# Altium footprint library PLC1.PcbLib: 118 footprints (part 6 of 8)
Each footprint in its own frame and in the unit in brackets; x right, y up, seen from the top. Pads: shape width x height; smd on the part's side, far side on the other; paste and mask are expansions set on the pad; w line width, h text height; cw(c..) or ccw(c..) is an arc to the next point about the centre after c.
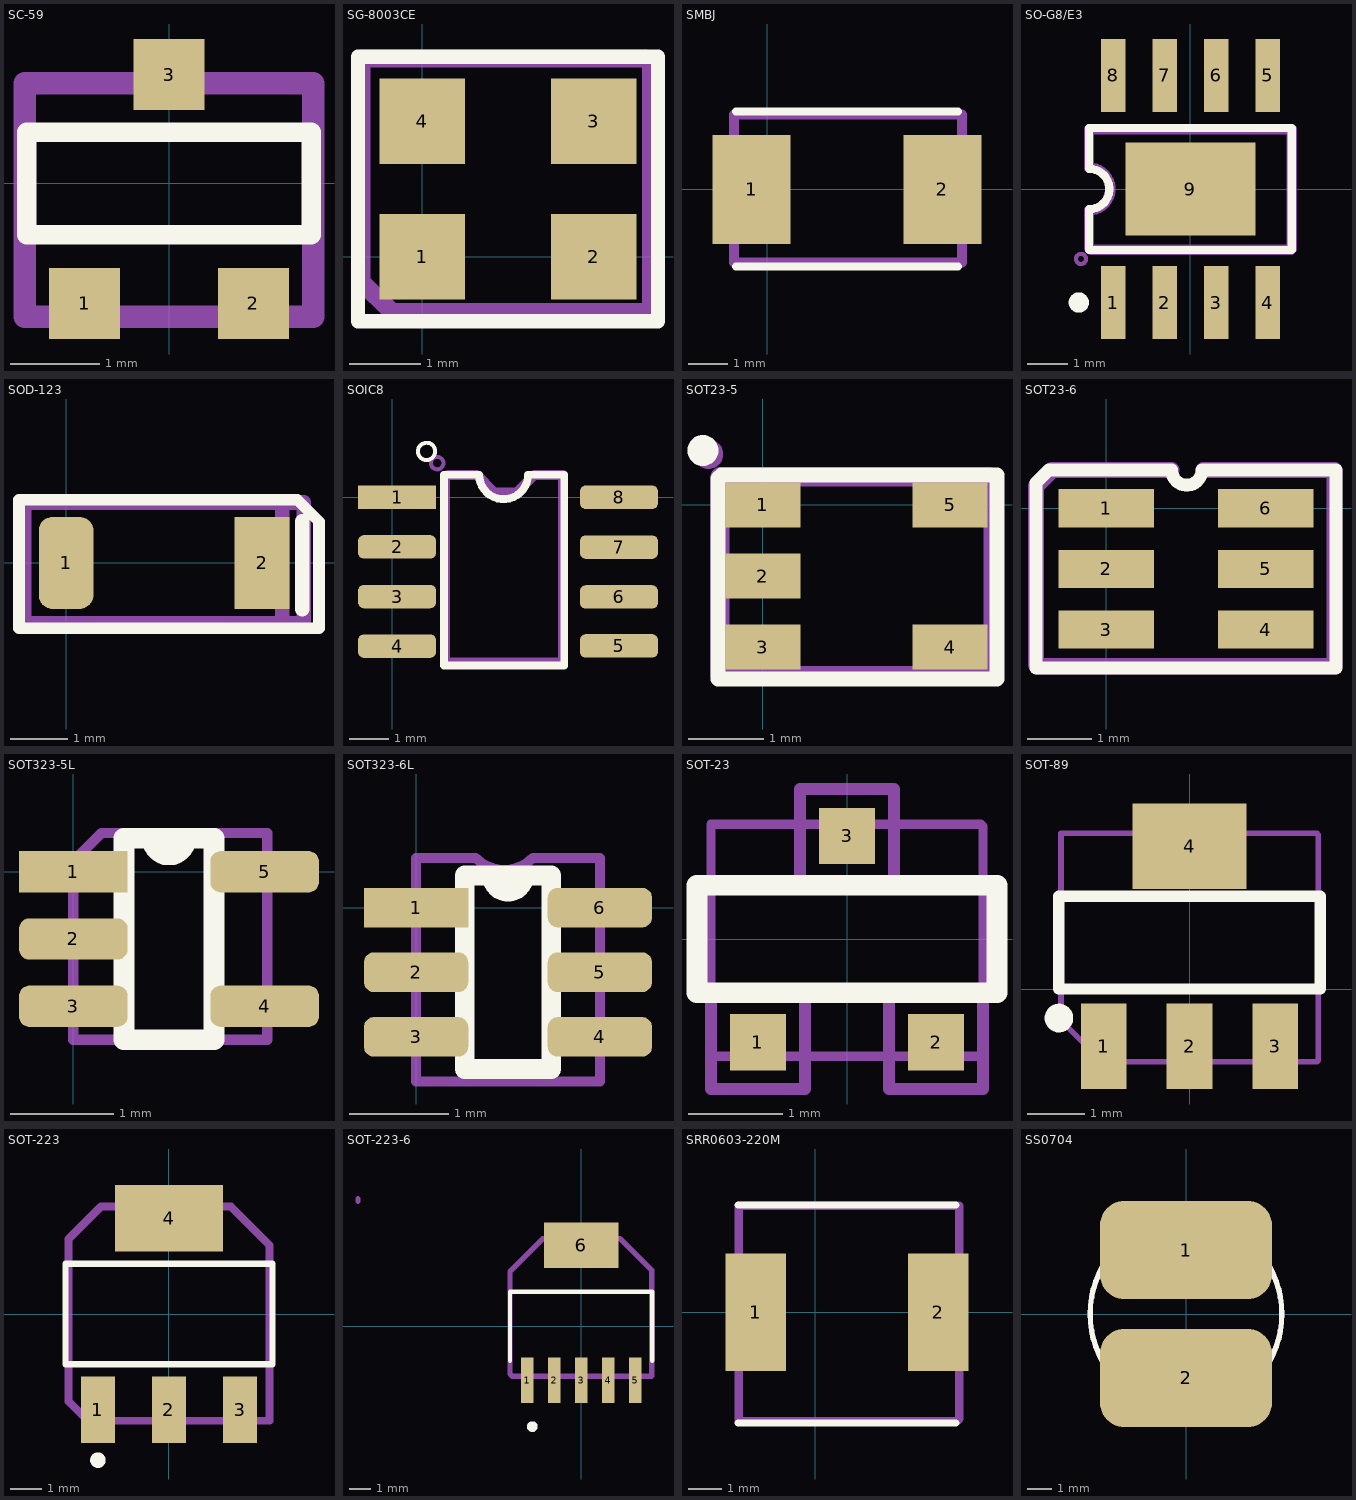
[diagram p5: the footprints below, top view; thin cyan lines are the x and y axes]

## SC-59 [mm] "SOT23, 3-Leads, Body 2.9x1.3mm, Pitch 0.95mm, Lead Span 2.3mm - Reverse Pinning, IPC Medium Density"
height 1.1
pads (3):
  rect 0.8x0.8 smd: 1(-0.95,-1.35) 2(0.95,-1.35) 3(0,1.225)
Top Overlay:
  lines w0.22: -1.6,-0.575 1.6,-0.575 1.6,0.575 -1.6,0.575 -1.6,-0.575
Mechanical 13:
  lines w0.127: -1.5,-0.6 1.5,-0.6 ; -1.5,0.6 1.5,0.6
Top Assy:
  lines w0.254: 1.625,-1.5 1.625,1.125 -1.625,1.125 -1.625,-1.5 1.625,-1.5 ; 1.625,-1.5 1.625,-1.5
  text ".Designator" at -1.4,-0.4 h0.7
3D body "User Library-P-SC 59-3-X HALL EFFECT.step": height 1.36, standoff -0.04, extent -1.525,-1.475 1.475,1.324

## SG-8003CE [mm]
pads (4):
  rect 1.2x1.2 smd: 1(0,0) 2(2.4,0) 3(2.4,1.9) 4(0,1.9)
Top Overlay:
  lines w0.2: -0.9,-0.9 -0.9,2.8 3.3,2.8 3.3,-0.9 -0.9,-0.9
Top Assy:
  lines w0.254: -0.85,-0.35 -0.85,2.775 3.125,2.775 3.2,2.7 3.2,-0.775 -0.425,-0.775 -0.85,-0.35
  text ".Designator" at -0.375,0.45 h0.7

## SMBJ [mm] "SMBJ"
height 2
pads (2):
  rect 2x2.8 smd: 1(-0.4,0) 2(4.5,0)
Top Overlay:
  lines w0.2: -0.8,-1.975 4.9,-1.975 ; -0.8,2 2.275,2 4.9,2 ; 4.9,2 4.9,2
Top Assy:
  lines w0.254: -0.85,-1.875 -0.85,1.925 5,1.925 5,-1.875 -0.85,-1.875
  text ".Designator" at -0.1,-0.275 h0.7
3D body "User Library-DO-214AA(SMB).step": height 2.6, standoff -0.05, extent -0.794,-1.975 4.794,1.975

## SO-G8/E3 [mm] "Small Outline; 8 Leads; Body Width 3.9 mm; Pitch 1.27 mm"
height 1.55
pads (9):
  rect 0.6x1.8 smd: 1(-1.905,-2.8) 2(-0.635,-2.8) 3(0.635,-2.8) 4(1.905,-2.8) 5(1.905,2.8) 6(0.635,2.8) 7(-0.635,2.8) 8(-1.905,2.8)
  rect 3.2x2.3 smd: 9(0,0)
Top Overlay:
  circle w0.25: c-2.755,-2.8 r0.125
  lines w0.2: -2.5,-1.5 2.5,-1.5 2.5,1.5 -2.5,1.5 -2.5,0.5 cw(c-2.5,0) -2.5,-0.5 -2.5,-1.5
Top Assy:
  circle w0.1: c-2.7,-1.725 r0.125
  lines w0.254: -2.5,-1.45 -2.45,-1.5 2.475,-1.5 2.5,-1.475 2.5,1.45 2.5,1.475 -2.5,1.475 -2.5,0.525 cw(c-2.499,0) -2.5,-0.525 -2.5,-1.45
  text ".Designator" at -1.7,-0.45 h0.7
3D body "CircuitWorks-SO-8.step": height 1.45, standoff 0, extent -2.5,-2.889 2.402,2.889

## SOD-123 [mm]
pads (2):
  rrect50% 0.95x1.6 smd: 1(0,0)
  rect 0.95x1.6 smd: 2(3.4,0)
Top Overlay:
  lines w0.2: -0.818,-1.137 -0.818,1.1 4.008,1.1 4.389,0.719 4.389,-1.137 3.168,-1.137 2.67,-1.137 2.19,-1.137 -0.818,-1.137
  lines w0.254: 4.1,-0.8 4.1,0.724
Top Assy:
  lines w0.254: 3.75,-0.925 3.75,0.9 ; -0.775,-1.05 4.125,-1.05 4.125,1.05 -0.725,1.05 -0.725,-1 -0.775,-1.05
  text ".Designator" at -0.3,-0.35 h0.7
3D body "User Library-MBR140SF.STEP": height 0.95, standoff 0, extent -0.175,-0.825 3.425,0.825

## SOIC8 [mm]
pads (8):
  rect 2x0.6 smd: 1(0.125,0)
  rrect50% 2x0.6 smd: 2(0.125,-1.27) 3(0.125,-2.54) 4(0.125,-3.81) 5(5.8,-3.8) 6(5.8,-2.55) 7(5.8,-1.275) 8(5.8,0)
Top Overlay:
  lines w0.1: 1.1,1.175 cw(c0.879,1.175) 1.1,1.182
  lines w0.2: 3.475,0.575 cw(c2.85,0.575) 2.225,0.575 1.325,0.575 1.325,-4.3 4.4,-4.3 4.4,0.575 3.5,0.575
Top Assy:
  circle w0.1: c1.15,0.875 r0.16
  lines w0.254: 1.35,-4.225 1.35,0.5 1.425,0.575 2.163,0.575 2.612,0.125 3.188,0.125 3.638,0.575 4.375,0.575 4.375,0.45 4.375,-4.225 1.35,-4.225
  text ".Designator" at 3.225,-3.875 h0.7
3D body "CircuitWorks-SO-8.step": height 1.45, standoff 0, extent 0.075,-4.351 5.853,0.551

## SOT23-5 [mm]
pads (5):
  rect 1x0.6 smd: 1(0,0) 2(0,-0.95) 3(0,-1.9) 4(2.5,-1.9) 5(2.5,0)
Top Overlay:
  circle w0.254: c-0.8,0.725 r0.079
  lines w0.2: -0.6,-2.325 -0.6,0.35 -0.55,0.4 1.275,0.4 3.125,0.4 3.125,-2.325 -0.6,-2.325
Top Assy:
  circle w0.1: c-0.725,0.675 r0.146
  lines w0.254: -0.575,-2.275 3.075,-2.275 3.075,0.325 3.025,0.375 -0.575,0.375 -0.575,-2.275
  text ".Designator" at -0.25,-1.225 h0.7
3D body "CircuitWorks-SOT-23-5.step": height 1.1, standoff 0, extent 0.025,-2.45 2.525,0.55

## SOT23-6 [mm]
pads (6):
  rect 1.5x0.6 smd: 1(0,0) 2(0,-0.95) 3(0,-1.9) 4(2.5,-1.9) 5(2.5,-0.95) 6(2.5,0)
Top Overlay:
  lines w0.2: -1.1,-2.5 3.6,-2.5 3.6,0.6 1.5,0.6 cw(c1.262,0.6) 1.025,0.6 -0.9,0.6 -1.1,0.4 -1.1,-2.5
Top Assy:
  lines w0.1: 1.025,0.625 ccw(c1.277,0.652) 1.525,0.6
  lines w0.254: 1.025,0.6 -0.85,0.6 -1.1,0.35 -1.1,-2.45 -1.075,-2.475 3.575,-2.475 3.575,0.6 1.525,0.6
  text ".Designator" at -0.7,-1.225 h0.7

## SOT323-5L [mm]
height 5
pads (5):
  rect 1.05x0.4 smd: 1(0,0)
  rrect50% 1.05x0.4 smd: 2(0,-0.65) 3(0,-1.3) 4(1.85,-1.3) 5(1.85,0)
Top Overlay:
  lines w0.2: 0.49,-1.625 1.36,-1.625 1.36,0.325 0.763,0.325 ccw(c0.925,0.325) 1.087,0.325 0.49,0.325 0.49,-1.625
Top Assy:
  lines w0.1: 0,-1.625 1.875,-1.625 1.875,0.375 1.406,0.375 1.05,0.375 0.469,0.375 0.275,0.375 0,0.1 0,-1.625
  text ".Designator" at 1.325,-1.425 h0.7
3D body "28014.stp": height 0.92, standoff -0.03, extent -0.125,-1.65 1.975,0.35

## SOT323-6L [mm]
pads (6):
  rect 1.05x0.4 smd: 1(0,0)
  rrect50% 1.05x0.4 smd: 2(0,-0.65) 3(0,-1.3) 4(1.85,-1.3) 5(1.85,-0.65) 6(1.85,0)
Top Overlay:
  lines w0.2: 0.49,-1.625 0.49,0.325 1.087,0.325 cw(c0.925,0.325) 0.763,0.325 1.36,0.325 1.36,-1.625 0.49,-1.625
Top Assy:
  lines w0.1: 0,-1.75 0,0.5 0.025,0.5 0.6,0.5 ccw(c0.887,0.787) 1.175,0.5 1.85,0.5 1.85,-1.75 0,-1.75
  text ".Designator" at 1.325,-1.6 h0.7
3D body "28014.stp": height 0.92, standoff -0.03, extent -0.125,-1.65 1.975,0.35

## SOT-23 [mm] "SOT23, 3-Leads, Body 2.9x1.3mm, Pitch 0.95mm, Lead Span 2.3mm - Reverse Pinning, IPC Medium Density"
height 1.1
pads (3):
  rect 0.6x0.6 smd: 1(-0.95,-1.1) 2(0.95,-1.1) 3(0,1.1)
Top Overlay:
  lines w0.22: -1.6,-0.575 -1.6,0.575 1.6,0.575 1.6,-0.575 -1.6,-0.575
Mechanical 13:
  lines w0.127: -1.45,-0.6 -1.45,-1.6 -0.45,-1.6 -0.45,-0.6 ; -0.5,0.6 -0.5,1.6 0.5,1.6 0.5,0.6 ; 0.45,-0.6 0.45,-1.6 1.45,-1.6 1.45,-0.6 ; -1.5,-0.6 1.5,-0.6 1.5,0.6 -1.5,0.6 -1.5,-0.6
Top Assy:
  lines w0.1: -1.45,-1.25 1.4,-1.25 1.45,-1.2 1.45,1.2 1.425,1.225 -1.45,1.225 -1.45,-1.25
  text ".Designator" at -1.225,-0.275 h0.7
3D body "SW3dPS-3-lead sot23-3.STEP": height 1.01, standoff -0.01, extent -1.46,-1.25 1.46,1.226

## SOT-89 [mm] "SOT-223/SC-73; 4 Leads; Body 6.7 x 7.3 mm, inc. leads (LxW max)"
height 1.8
pads (4):
  rect 0.8x1.5 smd: 1(-1.5,-1) 2(0,-1) 3(1.5,-1)
  rect 2x1.5 smd: 4(0,2.5)
Top Overlay:
  circle w0.25: c-2.286,-0.508 r0.125
  lines w0.2: -2.286,0 -2.286,1.625 2.286,1.625 2.286,0 -2.286,0
Top Assy:
  lines w0.1: -2.25,-0.55 -1.525,-1.275 2.225,-1.275 2.25,-1.25 2.25,2.7 2.225,2.725 -2.25,2.725 -2.25,-0.55
  text ".Designator" at -2.025,0.575 h0.7
3D body "CircuitWorks-SOT89.step": height 1.5, standoff 0, extent -2.25,-1.275 2.25,2.725

## SOT-223 [mm] "SOT-223/SC-73; 4 Leads; Body 6.7 x 7.3 mm, inc. leads (LxW max)"
height 1.8
pads (4):
  rect 1.1x2.15 smd: 1(-2.3,-3.1) 2(0,-3.1) 3(2.3,-3.1)
  rect 3.5x2.15 smd: 4(0,3.1)
Top Overlay:
  circle w0.25: c-2.3,-4.725 r0.125
  lines w0.2: -3.35,-1.625 -3.35,1.625 3.35,1.625 3.35,-1.625 -3.35,-1.625
Top Assy:
  lines w0.254: -3.25,-2.825 -3.25,2.425 -2.2,3.475 2,3.475 3.25,2.225 3.25,-3.45 -2.625,-3.45 -3.25,-2.825
  text ".Designator" at -3.05,-0.475 h0.7
3D body "User Library-sot-223.step": height 1.64, standoff -0.04, extent -3.25,-3.466 3.25,3.466

## SOT-223-6 [mm] "SOT-223-6/SC-73; 6Leads; Body 6.7 x 7.3 mm, inc. leads (LxW max)"
height 1.8
pads (6):
  rect 0.6x2.15 smd: 1(-2.54,-2.54) 2(-1.27,-2.54) 3(0,-2.54) 4(1.27,-2.54) 5(2.54,-2.54)
  rect 3.5x2.15 smd: 6(0,3.81)
Top Overlay:
  circle w0.25: c-2.3,-4.725 r0.125
  lines w0.2: -3.35,-1.625 -3.35,1.625 3.35,1.625 3.35,-1.625
Mechanical 13:
  lines w0.254: -10.5,5.875 -10.5,6
Top Assy:
  lines w0.254: -3.35,-2.25 -3.25,-2.35 3.3,-2.35 3.325,-2.325 3.325,2.625 1.825,4.125 -1.8,4.125 -3.35,2.575 -3.35,-2.25
  text ".Designator" at -2.95,0.025 h0.7
3D body "User Library-TPS73701DCQ.step": height 1.8, standoff 0, extent -3.275,-3.122 3.275,4.138

## SRR0603-220M [mm]
pads (2):
  rect 1.8x3.5 smd: 1(-1.775,0) 2(3.675,0)
Top Overlay:
  lines w0.2: -2.3,-3.3 4.2,-3.3 ; -2.3,3.2 0.3,3.2 4.2,3.2
Top Assy:
  lines w0.254: -2.275,-3.25 -2.275,3.175 4.3,3.175 4.3,-3.175 4.225,-3.25 -2.275,-3.25
  text ".Designator" at -1.575,-0.5 h0.7
3D body "User Library-IND-SRR0604_6x6x5.step": height 4.8, standoff 0, extent -2.25,-3.2 4.25,3.3

## SS0704 [mm] "Chip Inductor, Body o7.5mm"
height 4
pads (2):
  rrect50% 7x4 smd: 1(0,2.6) 2(0,-2.6)
Top Overlay:
  circle w0.22: c0,0 r3.9
Mechanical 13:
  circle w0.22: c0,0 r3.9
Top Assy:
  circle w0.1: c0,0 r3.916
  text ".Designator" at -3.525,-0.25 h0.7
3D body "SS0704.STEP": height 4, standoff 0, extent -3.75,-3.75 3.75,3.75